# Altium footprint library PcbLib.PcbLib: 428 footprints (part 18 of 27)
Each footprint in its own frame and in the unit in brackets; x right, y up, seen from the top. Pads: shape width x height; smd on the part's side, far side on the other; paste and mask are expansions set on the pad; w line width, h text height; cw(c..) or ccw(c..) is an arc to the next point about the centre after c.
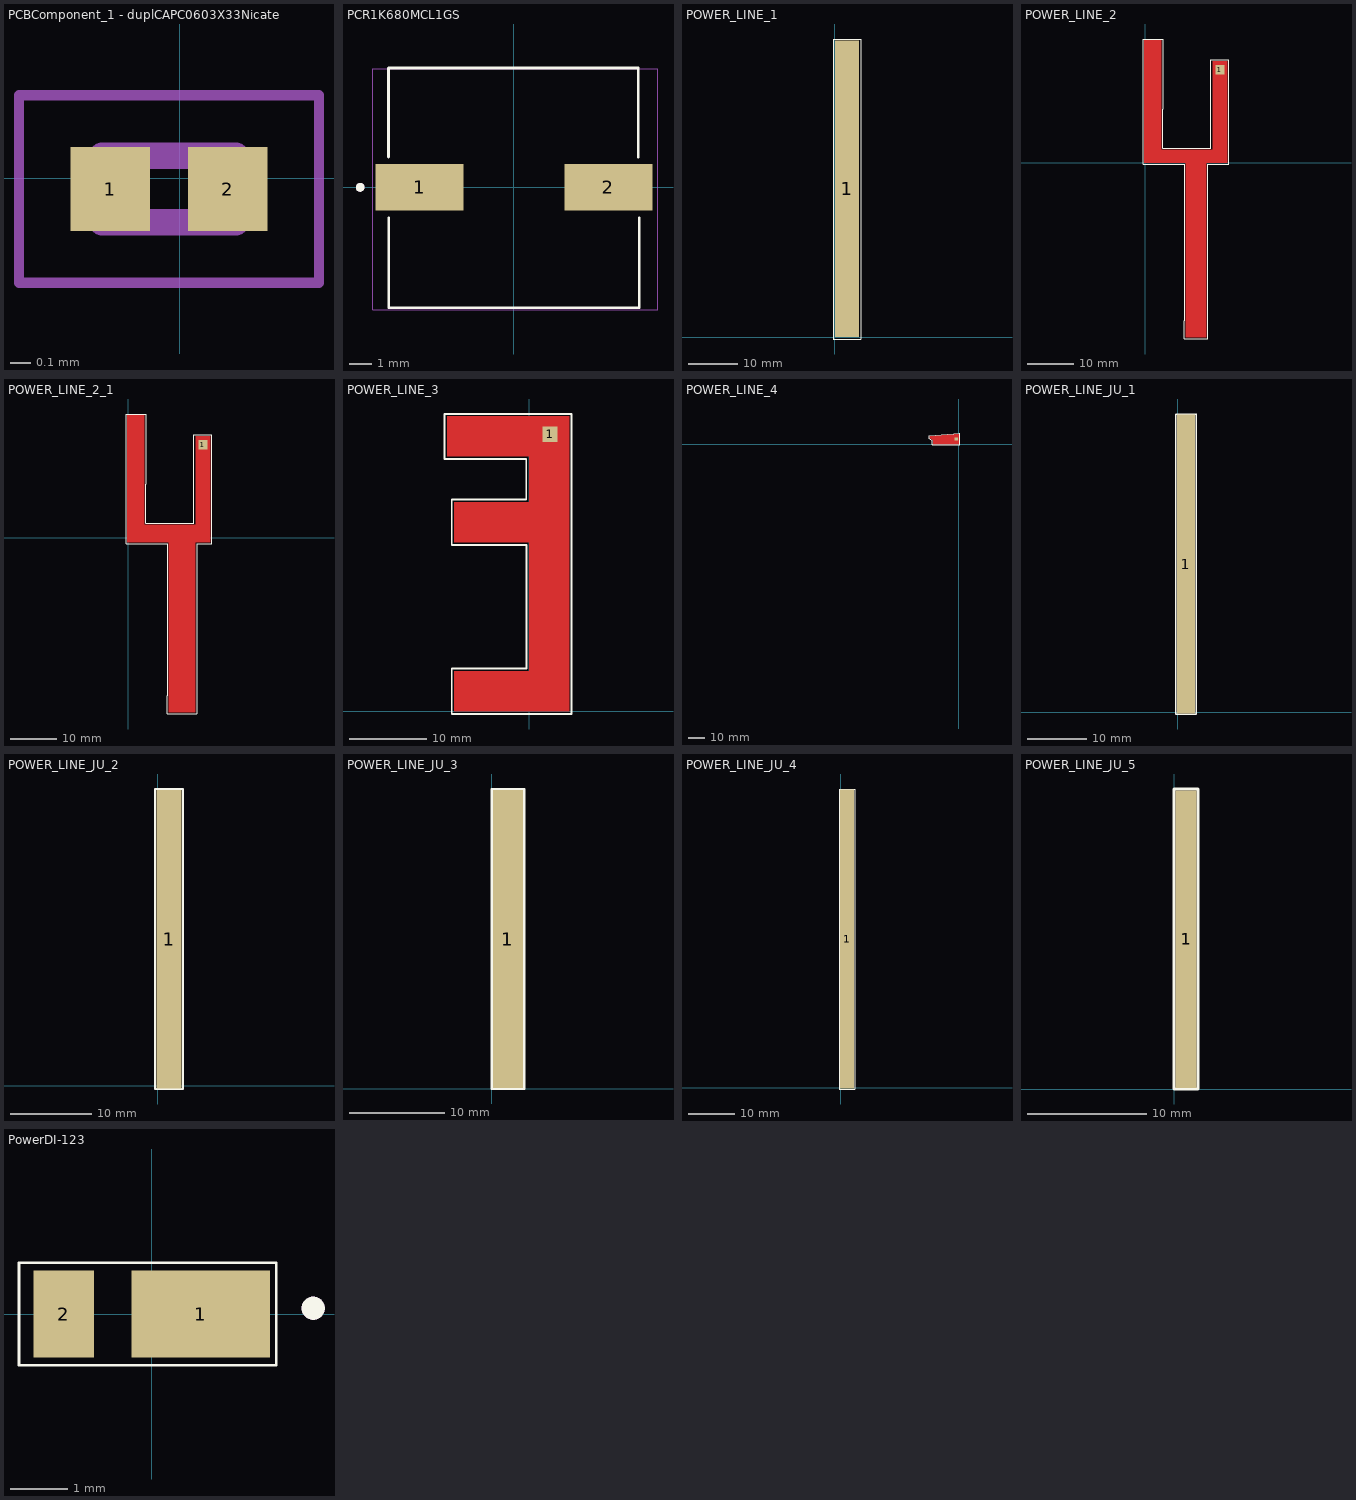
[diagram p17: the footprints below, top view; thin cyan lines are the x and y axes]

## PCBComponent_1 - duplCAPC0603X33Nicate [mm]
pads (2):
  rect 0.38x0.4 smd: 1(-0.332,-0.051) 2(0.23,-0.051)
Mechanical 13:
  lines w0.127: -0.371,-0.211 -0.371,0.109 0.269,0.109 0.269,-0.211 -0.371,-0.211
Mechanical 15:
  lines w0.05: -0.769,-0.499 -0.769,0.397 0.667,0.397 0.667,-0.499 -0.769,-0.499
3D body "step_temp.STEP": height 0.33, standoff 0, extent -0.351,-0.201 0.249,0.099

## PCBComponent_1 - duplicate1 [mm]

## PCBComponent_1 - duplicate2 [mm]

## PCR1K680MCL1GS [mm]
height 12.7
pads (2):
  rect 4.01x2.12 smd: 1(-4.3,0) 2(4.3,0)
Top Overlay:
  circle w0.2: c-7,0 r0.1
  lines w0.127: -5.71,1.38 -5.71,5.43 5.66,5.43 5.66,1.38 ; -5.7,-1.38 -5.7,-5.48 5.7,-5.48 5.7,-1.38
Mechanical 13:
  circle w0.2: c-7,0 r0.1
Mechanical 15:
  lines w0.05: -6.44,-5.579 -6.44,5.4 6.555,5.4 6.555,-5.579 -6.44,-5.579
3D body "CAP_PC_10X12P7_NCH.step": height 12.93, standoff -0.18, extent -5.611,-5.408 5.591,5.343

## PLP2-100 [mm]
3D body "PLP2-100.STEP": height 1.7, standoff -1.6, extent -1.651,-1.651 1.651,1.65

## POWER_LINE_1 [mm]
pads (1):
  rect 5x60.57 smd paste+0.229 mask+0: 1(2.5,30.284)
Top Overlay:
  lines w0.254: -0.35,-0.4 5.3,-0.4 5.3,60.85 -0.35,60.85 -0.35,-0.4
3D body: height 2, standoff 0.15, extent 0.25,0.251 4.751,60.318

## POWER_LINE_2 [mm]
pads (1):
  rect 2x2 smd: 1(16.2,20.15)
Top Layer:
  region: -0.2,26.55 -0.2,-0.001 8.8,-0.001 8.8,-38.001 13.2,-38.001 13.2,-0.001 17.8,-0.001 17.8,22 14.6,22 14.6,2.796 3.4,2.796 3.4,26.55
Top Overlay:
  lines w0.254: -0.5,-0.35 -0.5,26.85 3.75,26.85 3.75,11.537 3.75,3.15 14.25,3.15 14.25,22.35 18.15,22.35 18.15,-0.35 13.55,-0.35 13.55,-38.35 8.45,-38.35 8.45,-34.4 8.45,-0.35 -0.5,-0.35
3D body: height 2, standoff 0.15, extent 0.048,-37.749 17.55,26.292

## POWER_LINE_2_1 [mm]
pads (1):
  rect 2x2 smd: 1(16.2,20.15)
Top Layer:
  region: -0.2,26.55 -0.2,-1.016 8.8,-1.016 8.8,-38.001 14.503,-38.001 14.503,-1.016 17.8,-1.016 17.8,22 14.6,22 14.6,2.796 3.4,2.796 3.4,26.55
Top Overlay:
  lines w0.254: -0.5,-1.346 8.45,-1.346 8.45,-34.4 8.45,-38.35 14.834,-38.35 14.834,-1.321 18.15,-1.321 18.15,22.35 14.25,22.35 14.25,3.15 3.75,3.15 3.75,11.537 3.75,26.85 -0.5,26.85 -0.5,-1.346
3D body: height 2, standoff 0.15, extent 0.048,-37.749 17.55,26.292

## POWER_LINE_3 [mm]
pads (1):
  rect 2x2 smd: 1(2.7,36.05)
Top Layer:
  region: 5.168,38.4 -10.7,38.4 -10.7,33.213 -0.014,33.213 -0.014,27.197 -9.8,27.197 -9.8,22.005 -0.015,22.014 -0.016,5.184 -9.8,5.194 -9.8,0 5.168,0 5.168,27.197 5.168,33.213
Top Overlay:
  lines w0.254: -11.05,32.85 -0.4,32.85 -0.4,27.55 -10.1,27.55 -10.1,21.65 -0.35,21.65 -0.35,5.55 -10.1,5.55 -10.1,-0.35 5.5,-0.35 5.5,38.7 -11.05,38.7 -11.05,32.85
3D body: height 2, standoff 0.15, extent -10.45,0.25 4.924,38.15

## POWER_LINE_4 [mm]
pads (1):
  rect 2x2 smd: 1(-1.4,3.2)
Top Layer:
  region: 0,0 -15.75,0 -15.75,2.4 -17.65,3.7 -17.65,5.1 0.45,6.433 0.45,0
Top Overlay:
  lines w0.254: -17.95,3.45 cw(c-68.895,-73.942) -16.1,2.2 -16.1,-0.35 0.8,-0.35 0.8,6.8 -17.95,5.4 -17.95,3.45
3D body: height 2, standoff 0.15, extent -17.398,0.25 0.199,6.165

## POWER_LINE_JU_1 [mm]
pads (1):
  rect 3.1x50.6 smd paste+0 mask+0: 1(1.4,25.084)
Top Overlay:
  lines w0.254: -0.3,-0.3 -0.3,50.5 3.1,50.5 3.1,-0.3 -0.3,-0.3
3D body: height 2, standoff 0.1, extent 0,0 2.8,50.2

## POWER_LINE_JU_2 [mm]
pads (1):
  rect 3.1x36.8 smd paste+0 mask+0: 1(1.4,18.084)
Top Overlay:
  lines w0.254: -0.3,-0.4 3.1,-0.4 3.1,36.6 -0.3,36.6 -0.3,-0.4
3D body: height 2, standoff 0.1, extent 0,-0.1 2.8,36.3

## POWER_LINE_JU_3 [mm]
pads (1):
  rect 3.1x31.2 smd paste+0 mask+0: 1(1.7,15.684)
Top Overlay:
  lines w0.254: 0,0 0,31.4 3.4,31.4 3.4,0 0,0
3D body: height 2, standoff 0.1, extent 0.3,0.3 3.1,31.1

## POWER_LINE_JU_4 [mm]
pads (1):
  rect 3.1x65 smd paste+0 mask+0: 1(1.4,32.284)
Top Overlay:
  lines w0.254: -0.3,-0.3 3.1,-0.3 3.1,64.9 -0.3,64.9 -0.3,-0.3
3D body: height 2, standoff 0.1, extent 0,0 2.8,64.6

## POWER_LINE_JU_5 [mm]
pads (1):
  rect 1.8x25 smd paste+0 mask+0: 1(1,12.584)
Top Overlay:
  lines w0.254: 0,0 2,0 2,25.2 0,25.2 0,0
3D body: height 2, standoff 0.1, extent 0.2,0.2 1.8,25

## PowerDI-123 [mm]
pads (2):
  rect 2.4x1.5 smd: 1(0.85,0)
  rect 1.05x1.5 smd: 2(-1.525,0)
Top Overlay:
  circle w0.2: c2.8,0.1 r0.1
  lines w0.05: -2.3,-0.889 2.159,-0.889 2.159,0.889 -2.3,0.889 -2.3,-0.889
Mechanical 13:
  circle w0.2: c2.8,0.1 r0.1
3D body "step_temp.STEP": height 1, standoff 0, extent -1.85,-0.89 1.85,0.89